# Altium schematic symbol library microbuilder.SCHLIB: 530 symbols (part 5 of 7) (continued)
## MAX6364 (continued)
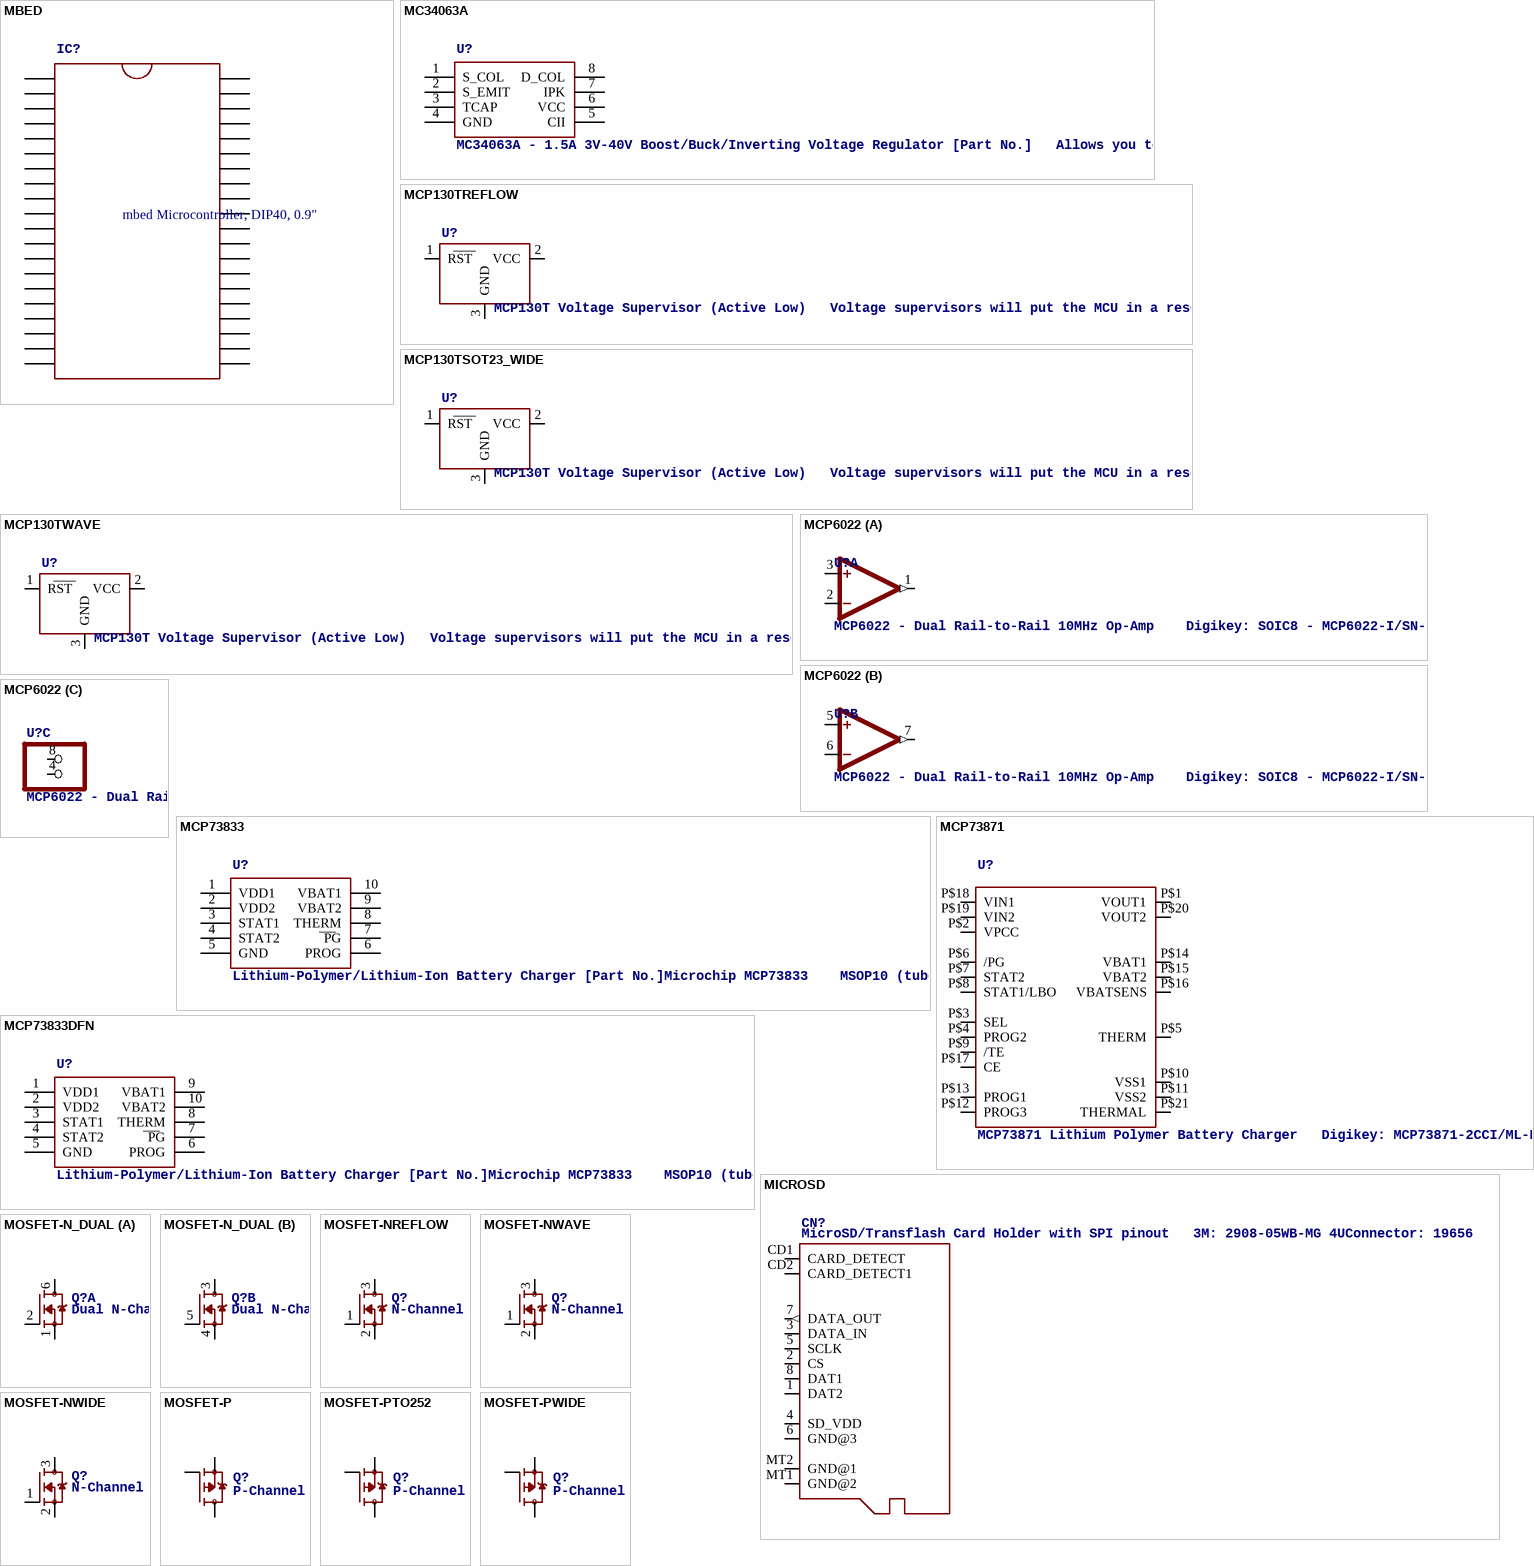
[diagram p43: symbols MBED to MOSFET-PWIDE]

## MBED
designator IC?, comment mbed Microcontroller, DIP40, 0.9"
footprint DIL40_0.9
pins: 1 P$1, 2 P$2, 3 P$3, 4 P$4, 5 P$5, 6 P$6, 7 P$7, 8 P$8, 9 P$9, 10 P$10, 11 P$11, 12 P$12, 13 P$13, 14 P$14, 15 P$15, 16 P$16, 17 P$17, 18 P$18, 19 P$19, 20 P$20, 21 P$21, 22 P$22, 23 P$23, 24 P$24, 25 P$25, 26 P$26, 27 P$27, 28 P$28, 29 P$29, 30 P$30, 31 P$31, 32 P$32, 33 P$33, 34 P$34, 35 P$35, 36 P$36, 37 P$37, 38 P$38, 39 P$39, 40 P$40

## MC34063A
designator U?, comment MC34063A - 1.5A 3V-40V Boost/Buck/Inverting Voltage Regulator [Part No.]   Allows you to 'boost', reduce or invert the voltage of your power supply to a more appropriate level.  Common voltage regulators like the LM1117 are easy to use, but they can only 'reduce' the voltage level and require more volts than they provide, making them useless for low voltage power supplies like batteries or solar panels. A 'Step-Up' regulator like the MC34063A solves this problem by also allowing you to increase the voltage to a pre-determined level, though you still need to pay attention to the minimum voltage level the converter can handle, keeping in mind that many 'step-up' converts are less efficient at the two extreme ends of their working range.   Given that many step-up circuits introduce some ripple to the power supply, you can often get a much 'smoother' supply by boosting the voltage up to 5.0V and then using a standard fixed voltage regulator (such as the common LM1117, etc.) to drop the voltage back down to 3.3V.  This may not be necessary, and some step up regulators can provide a smooth supply on their own, but it's worth keeping in mind if you do encounter some ripple in the power supply using only a step-up IC for your power supply.Texas Instruments MC34063A    Digikey: 296-17765-1-ND
footprint SOIC8_150MIL
pins: 1 S_COL, 2 S_EMIT, 3 TCAP, 4 GND, 5 CII, 6 VCC, 7 IPK, 8 D_COL

## MCP130TREFLOW
designator U?, comment MCP130T Voltage Supervisor (Active Low)   Voltage supervisors will put the MCU in a reset state if the voltage drops below a pre-determined level.   SOT23-R/SOT23-W: Voltage Supervisor - 3.15V Active Low       Note: Use the "Reflow" footprint when working with solder paste, and the "Wave" footprint when soldering by hand with a soldering iron (the latter has larger pads that are easier to solder by hand).   Digikey: MCP130T-315I/TTCT-ND
footprint SOT23-R
pins: 1 RST, 2 VCC (power), 3 GND (power)

## MCP130TSOT23_WIDE
designator U?, comment MCP130T Voltage Supervisor (Active Low)   Voltage supervisors will put the MCU in a reset state if the voltage drops below a pre-determined level.   SOT23-R/SOT23-W: Voltage Supervisor - 3.15V Active Low       Note: Use the "Reflow" footprint when working with solder paste, and the "Wave" footprint when soldering by hand with a soldering iron (the latter has larger pads that are easier to solder by hand).   Digikey: MCP130T-315I/TTCT-ND
footprint SOT23-WIDE
pins: 1 RST, 2 VCC (power), 3 GND (power)

## MCP130TWAVE
designator U?, comment MCP130T Voltage Supervisor (Active Low)   Voltage supervisors will put the MCU in a reset state if the voltage drops below a pre-determined level.   SOT23-R/SOT23-W: Voltage Supervisor - 3.15V Active Low       Note: Use the "Reflow" footprint when working with solder paste, and the "Wave" footprint when soldering by hand with a soldering iron (the latter has larger pads that are easier to solder by hand).   Digikey: MCP130T-315I/TTCT-ND
footprint SOT23-W
pins: 1 RST, 2 VCC (power), 3 GND (power)

## MCP6022
designator U?, comment MCP6022 - Dual Rail-to-Rail 10MHz Op-Amp    Digikey: SOIC8 - MCP6022-I/SN-ND
footprint SOIC8_150MIL
part A pins: 1 OUT (out), 2 -IN, 3 +IN
part B pins: 5 +IN, 6 -IN, 7 OUT (out)
part C pins: 4 -, 8 +

## MCP73833
designator U?, comment Lithium-Polymer/Lithium-Ion Battery Charger [Part No.]Microchip MCP73833    MSOP10 (tube only):   Digikey: MCP73833T-AMI/UN or MCP73833-FCI/UN-ND Mouser: 579-MCP73833-AMI/UN   DFN10 (tape):   Digikey:    Note Chips ending in 'AMI' have no timer, and chips ending in 'FCI' have a 6-hour timer that will end the charge sequence after 6 horus regqrdless of current charge level.
footprint MSOP10
pins: 1 VDD1, 2 VDD2, 3 STAT1, 4 STAT2, 5 GND, 6 PROG, 7 PG, 8 THERM, 9 VBAT2, 10 VBAT1

## MCP73833DFN
designator U?, comment Lithium-Polymer/Lithium-Ion Battery Charger [Part No.]Microchip MCP73833    MSOP10 (tube only):   Digikey: MCP73833T-AMI/UN or MCP73833-FCI/UN-ND Mouser: 579-MCP73833-AMI/UN   DFN10 (tape):   Digikey:    Note Chips ending in 'AMI' have no timer, and chips ending in 'FCI' have a 6-hour timer that will end the charge sequence after 6 horus regqrdless of current charge level.
footprint DFN10_3X3MM
pins: 1 VDD1, 2 VDD2, 3 STAT1, 4 STAT2, 5 GND, 6 PROG, 7 PG, 8 THERM, 9 VBAT1, 10 VBAT2

## MCP73871
designator U?, comment MCP73871 Lithium Polymer Battery Charger   Digikey: MCP73871-2CCI/ML-ND
footprint QFN20_4MM
pins: P$1 VOUT1, P$2 VPCC, P$3 SEL, P$4 PROG2, P$5 THERM, P$6 /PG, P$7 STAT2, P$8 STAT1/LBO, P$9 /TE, P$10 VSS1, P$11 VSS2, P$12 PROG3, P$13 PROG1, P$14 VBAT1, P$15 VBAT2, P$16 VBATSENS, P$17 CE, P$18 VIN1, P$19 VIN2, P$20 VOUT2, P$21 THERMAL

## MICROSD
designator CN?, comment MicroSD/Transflash Card Holder with SPI pinout   3M: 2908-05WB-MG 4UConnector: 19656   Footprint courtesy: Adafruit Industries
footprint MICROSD
pins: 1 DAT2, 2 CS, 3 DATA_IN, 4 SD_VDD (power), 5 SCLK, 6 GND@3 (power), 7 DATA_OUT (out), 8 DAT1, CD1 CARD_DETECT, CD2 CARD_DETECT1, MT1 GND@2 (power), MT2 GND@1 (power)

## MOSFET-N_DUAL
designator Q?, comment Dual N-Channel MOSFET   SOT363 (2.0x1.25mm) 2N7002PS - 60V, 320mA [Digikey: 568-5984-1-ND]
footprint SOT363
part A pins: 1 S, 2 G, 6 D
part B pins: 3 D, 4 S, 5 G

## MOSFET-NREFLOW
designator Q?, comment N-Channel Mosfet   LEGEND   VDS: Voltage Drain-Source ID: Drain Current RDS(ON): Drain-Source On-State Resistance VGS(TH): Gate-Source Threshold Voltage CISS: Drain-Source Input Capacitance    SOT-23   Name	VDS	ID	RDS(ON)	VGS(TH)	CISS	Order Number	   2N7002E	60V	260mA	2.5 Ohm	2.5V @ 250uA	26.7pF @ 25V	2N7002ET1GOSTR-ND	   BSH103	30V	850mA	400 mOhm	400mV @ 1mA	83pF @ 24V	BSH103,235-ND	   BSS138	60V	320mA	1.6 Ohm	1.5V @ 250uA	50pF @ 10V	Mouser: 771-BSS138PW115	   DMN2075U-7	20V	4.2A	38 mOhm	1V @ 250 uA	594.3pF @ 10V	DMN2075U-7DICT-ND	   							   * BSS138 good choice for I2C level-shifting
footprint SOT23-R
pins: 1 G, 2 S, 3 D

## MOSFET-NWAVE
designator Q?, comment N-Channel Mosfet   LEGEND   VDS: Voltage Drain-Source ID: Drain Current RDS(ON): Drain-Source On-State Resistance VGS(TH): Gate-Source Threshold Voltage CISS: Drain-Source Input Capacitance    SOT-23   Name	VDS	ID	RDS(ON)	VGS(TH)	CISS	Order Number	   2N7002E	60V	260mA	2.5 Ohm	2.5V @ 250uA	26.7pF @ 25V	2N7002ET1GOSTR-ND	   BSH103	30V	850mA	400 mOhm	400mV @ 1mA	83pF @ 24V	BSH103,235-ND	   BSS138	60V	320mA	1.6 Ohm	1.5V @ 250uA	50pF @ 10V	Mouser: 771-BSS138PW115	   DMN2075U-7	20V	4.2A	38 mOhm	1V @ 250 uA	594.3pF @ 10V	DMN2075U-7DICT-ND	   							   * BSS138 good choice for I2C level-shifting
footprint SOT23-W
pins: 1 G, 2 S, 3 D

## MOSFET-NWIDE
designator Q?, comment N-Channel Mosfet   LEGEND   VDS: Voltage Drain-Source ID: Drain Current RDS(ON): Drain-Source On-State Resistance VGS(TH): Gate-Source Threshold Voltage CISS: Drain-Source Input Capacitance    SOT-23   Name	VDS	ID	RDS(ON)	VGS(TH)	CISS	Order Number	   2N7002E	60V	260mA	2.5 Ohm	2.5V @ 250uA	26.7pF @ 25V	2N7002ET1GOSTR-ND	   BSH103	30V	850mA	400 mOhm	400mV @ 1mA	83pF @ 24V	BSH103,235-ND	   BSS138	60V	320mA	1.6 Ohm	1.5V @ 250uA	50pF @ 10V	Mouser: 771-BSS138PW115	   DMN2075U-7	20V	4.2A	38 mOhm	1V @ 250 uA	594.3pF @ 10V	DMN2075U-7DICT-ND	   							   * BSS138 good choice for I2C level-shifting
footprint SOT23-WIDE
pins: 1 G, 2 S, 3 D

## MOSFET-P
designator Q?, comment P-Channel Mosfet   LEGEND   VDS: Voltage Drain-Source ID: Drain Current RDS(ON): Drain-Source On-State Resistance VGS(TH): Gate-Source Threshold Voltage CISS: Drain-Source Input Capacitance    SOT-23   Name	VDS	ID	RDS(ON)	VGS(TH)	CISS	Order Number	   IRLML5103	30V	760mA	600 mOhm	--	75pF @ 25V	Digikey: IRLML5103PBFCT-ND	   IRLML6401	12V	4.3A	50 mOhm	950mV @ 250µA	830pF @ 10V	Digikey: IRLML6401PBFTR-ND	   NTR0202PL	20V	400mA	800 mOhm	2.3V @ 250uA	70pF @ 5V	Digikey: NTR0202PLT1GOSTR-ND	   NTR4101PT1G	20V	1.8A	85 mOhm	1.2V @ 250uA	675pF @ 10V	Digikey: NTR4101PT1GOSCT-ND	   DMP2004K	20V	600mA	900 mOhm	1V @ 250uA	175pF @ 16V	Digikey: DMP2004KDICT-ND	   PMV65XP	20V	3.9A	76 mOhm	950mV @ 1mA	725pF @ 20V	Digikey: 568-2358-2-ND	   							   							TO-252   Name	VDS	ID	RDS(ON)	VGS(TH)	CISS	Order Number	   AOD417	30V	25A	34 mOhm	3V @ 250µA	920pF @ 15V	Digikey: 785-1106-2-ND
footprint SOT23-R
pins: 1 G, 2 S, 3 D

## MOSFET-PTO252
designator Q?, comment P-Channel Mosfet   LEGEND   VDS: Voltage Drain-Source ID: Drain Current RDS(ON): Drain-Source On-State Resistance VGS(TH): Gate-Source Threshold Voltage CISS: Drain-Source Input Capacitance    SOT-23   Name	VDS	ID	RDS(ON)	VGS(TH)	CISS	Order Number	   IRLML5103	30V	760mA	600 mOhm	--	75pF @ 25V	Digikey: IRLML5103PBFCT-ND	   IRLML6401	12V	4.3A	50 mOhm	950mV @ 250µA	830pF @ 10V	Digikey: IRLML6401PBFTR-ND	   NTR0202PL	20V	400mA	800 mOhm	2.3V @ 250uA	70pF @ 5V	Digikey: NTR0202PLT1GOSTR-ND	   NTR4101PT1G	20V	1.8A	85 mOhm	1.2V @ 250uA	675pF @ 10V	Digikey: NTR4101PT1GOSCT-ND	   DMP2004K	20V	600mA	900 mOhm	1V @ 250uA	175pF @ 16V	Digikey: DMP2004KDICT-ND	   PMV65XP	20V	3.9A	76 mOhm	950mV @ 1mA	725pF @ 20V	Digikey: 568-2358-2-ND	   							   							TO-252   Name	VDS	ID	RDS(ON)	VGS(TH)	CISS	Order Number	   AOD417	30V	25A	34 mOhm	3V @ 250µA	920pF @ 15V	Digikey: 785-1106-2-ND
footprint TO252
pins: 1 G, 2 S, 3 D

## MOSFET-PWIDE
designator Q?, comment P-Channel Mosfet   LEGEND   VDS: Voltage Drain-Source ID: Drain Current RDS(ON): Drain-Source On-State Resistance VGS(TH): Gate-Source Threshold Voltage CISS: Drain-Source Input Capacitance    SOT-23   Name	VDS	ID	RDS(ON)	VGS(TH)	CISS	Order Number	   IRLML5103	30V	760mA	600 mOhm	--	75pF @ 25V	Digikey: IRLML5103PBFCT-ND	   IRLML6401	12V	4.3A	50 mOhm	950mV @ 250µA	830pF @ 10V	Digikey: IRLML6401PBFTR-ND	   NTR0202PL	20V	400mA	800 mOhm	2.3V @ 250uA	70pF @ 5V	Digikey: NTR0202PLT1GOSTR-ND	   NTR4101PT1G	20V	1.8A	85 mOhm	1.2V @ 250uA	675pF @ 10V	Digikey: NTR4101PT1GOSCT-ND	   DMP2004K	20V	600mA	900 mOhm	1V @ 250uA	175pF @ 16V	Digikey: DMP2004KDICT-ND	   PMV65XP	20V	3.9A	76 mOhm	950mV @ 1mA	725pF @ 20V	Digikey: 568-2358-2-ND	   							   							TO-252   Name	VDS	ID	RDS(ON)	VGS(TH)	CISS	Order Number	   AOD417	30V	25A	34 mOhm	3V @ 250µA	920pF @ 15V	Digikey: 785-1106-2-ND
footprint SOT23-WIDE
pins: 1 G, 2 S, 3 D

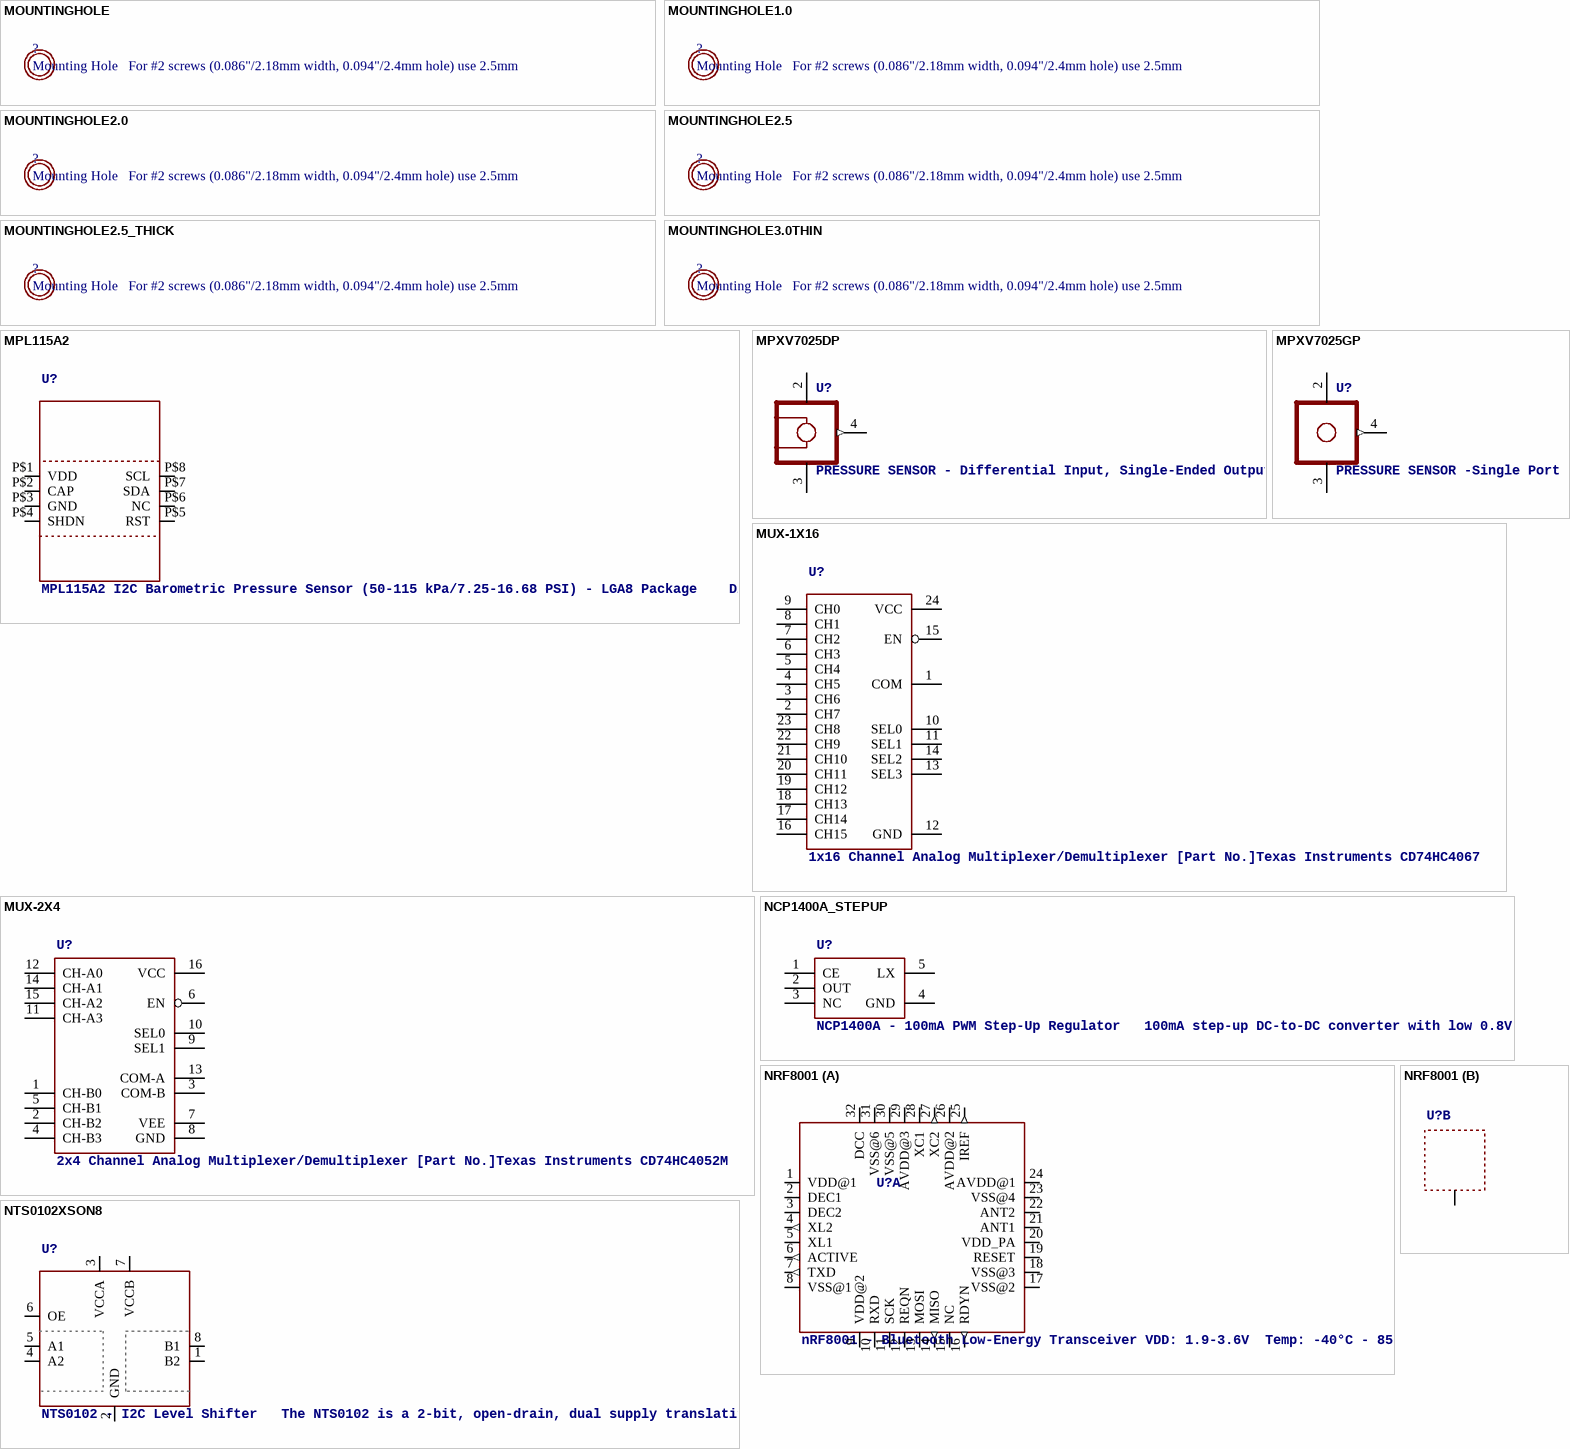
[diagram p44: symbols MOUNTINGHOLE to NTS0102XSON8]

## MOUNTINGHOLE
designator ?, comment Mounting Hole   For #2 screws (0.086"/2.18mm width, 0.094"/2.4mm hole) use 2.5mm
footprint MOUNTINGHOLE_3.0_PLATED

## MOUNTINGHOLE1.0
designator ?, comment Mounting Hole   For #2 screws (0.086"/2.18mm width, 0.094"/2.4mm hole) use 2.5mm
BOM: EXCLUDE
footprint MOUNTINGHOLE_1.0_PLATED

## MOUNTINGHOLE2.0
designator ?, comment Mounting Hole   For #2 screws (0.086"/2.18mm width, 0.094"/2.4mm hole) use 2.5mm
footprint MOUNTINGHOLE_2.0_PLATED

## MOUNTINGHOLE2.5
designator ?, comment Mounting Hole   For #2 screws (0.086"/2.18mm width, 0.094"/2.4mm hole) use 2.5mm
footprint MOUNTINGHOLE_2.5_PLATED

## MOUNTINGHOLE2.5_THICK
designator ?, comment Mounting Hole   For #2 screws (0.086"/2.18mm width, 0.094"/2.4mm hole) use 2.5mm
footprint MOUNTINGHOLE_2.5_PLATED_THICK

## MOUNTINGHOLE3.0THIN
designator ?, comment Mounting Hole   For #2 screws (0.086"/2.18mm width, 0.094"/2.4mm hole) use 2.5mm
footprint MOUNTINGHOLE_3.0_PLATEDTHIN

## MPL115A2
designator U?, comment MPL115A2 I2C Barometric Pressure Sensor (50-115 kPa/7.25-16.68 PSI) - LGA8 Package    Digikey: MPL115A2T1CT-ND
footprint LGA8
pins: P$1 VDD (power), P$2 CAP, P$3 GND (power), P$4 SHDN, P$5 RST, P$6 NC, P$7 SDA, P$8 SCL

## MPXV7025DP
designator U?, comment PRESSURE SENSOR - Differential Input, Single-Ended Output
footprint SOP8-1351
pins: 2 VS (power), 3 GND (power), 4 +VOUT (out)

## MPXV7025GP
designator U?, comment PRESSURE SENSOR -Single Port
footprint SOP8-1369
pins: 2 VS (power), 3 GND (power), 4 OUT (out)

## MUX-1X16
designator U?, comment 1x16 Channel Analog Multiplexer/Demultiplexer [Part No.]Texas Instruments CD74HC4067    Digikey: 296-9226-6-ND
footprint SSOP24
pins: 1 COM, 2 CH7, 3 CH6, 4 CH5, 5 CH4, 6 CH3, 7 CH2, 8 CH1, 9 CH0, 10 SEL0, 11 SEL1, 12 GND, 13 SEL3, 14 SEL2, 15 EN, 16 CH15, 17 CH14, 18 CH13, 19 CH12, 20 CH11, 21 CH10, 22 CH9, 23 CH8, 24 VCC

## MUX-2X4
designator U?, comment 2x4 Channel Analog Multiplexer/Demultiplexer [Part No.]Texas Instruments CD74HC4052M    Digikey: 296-9218-5-ND
footprint SOIC16
pins: 1 CH-B0, 2 CH-B2, 3 COM-B, 4 CH-B3, 5 CH-B1, 6 EN, 7 VEE, 8 GND, 9 SEL1, 10 SEL0, 11 CH-A3, 12 CH-A0, 13 COM-A, 14 CH-A1, 15 CH-A2, 16 VCC

## NCP1400A_STEPUP
designator U?, comment NCP1400A - 100mA PWM Step-Up Regulator   100mA step-up DC-to-DC converter with low 0.8V startup. 3.3V Version (SOT23-5) - Digikey: NCP1400ASN33T1GOSCT-ND  5.0V Version (SOT23-5) - Digikey: NCP1400ASN50T1GOSCT-ND       NCP1402 - 200mA PWM Step-Up Regulator   200mA step-up DC-to-DC converter with low 0.8V startup 3.3V Version (SOT23-5) - Digikey: NCP1402SN33T1GOSCT-ND  5.0V Version (SOT23-5) - Digikey: NCP1402SN50T1GOSCT-ND
footprint SOT23-5
pins: 1 CE, 2 OUT, 3 NC, 4 GND, 5 LX

## NRF8001
designator U?, comment nRF8001 - Bluetooth Low-Energy Transceiver VDD: 1.9-3.6V  Temp: -40°C - 85°C
footprint QFN32_5MM
part A pins: 1 VDD@1 (power), 2 DEC1, 3 DEC2, 4 XL2 (out), 5 XL1, 6 ACTIVE (out), 7 TXD (out), 8 VSS@1 (power), 9 VDD@2 (power), 10 RXD, 11 SCK, 12 REQN, 13 MOSI, 14 MISO (out), 15 NC, 16 RDYN (out), 17 VSS@2 (power), 18 VSS@3 (power), 19 RESET, 20 VDD_PA, 21 ANT1, 22 ANT2, 23 VSS@4 (power), 24 AVDD@1 (power), 25 IREF (out), 26 AVDD@2 (power), 27 XC2 (out), 28 XC1, 29 AVDD@3 (power), 30 VSS@5 (power), 31 VSS@6 (power), 32 DCC
part B pins: 33 TP (power)

## NTS0102XSON8
designator U?, comment NTS0102 - I2C Level Shifter   The NTS0102 is a 2-bit, open-drain, dual supply translating transceiver with auto direction sensing, that enables bidirectional voltage level translation. VCCA: 1.65-3.6V  VCCB: 2.3V-5.5V  Max Data Rate: 50 Mbps  Temperature: -40°C - 125°C     XSON8 Package (NTS0102GT) - Mouser: 771-NTS0102GT115
footprint SOT833-1
pins: 1 B2, 2 GND, 3 VCCA, 4 A2, 5 A1, 6 OE, 7 VCCB, 8 B1

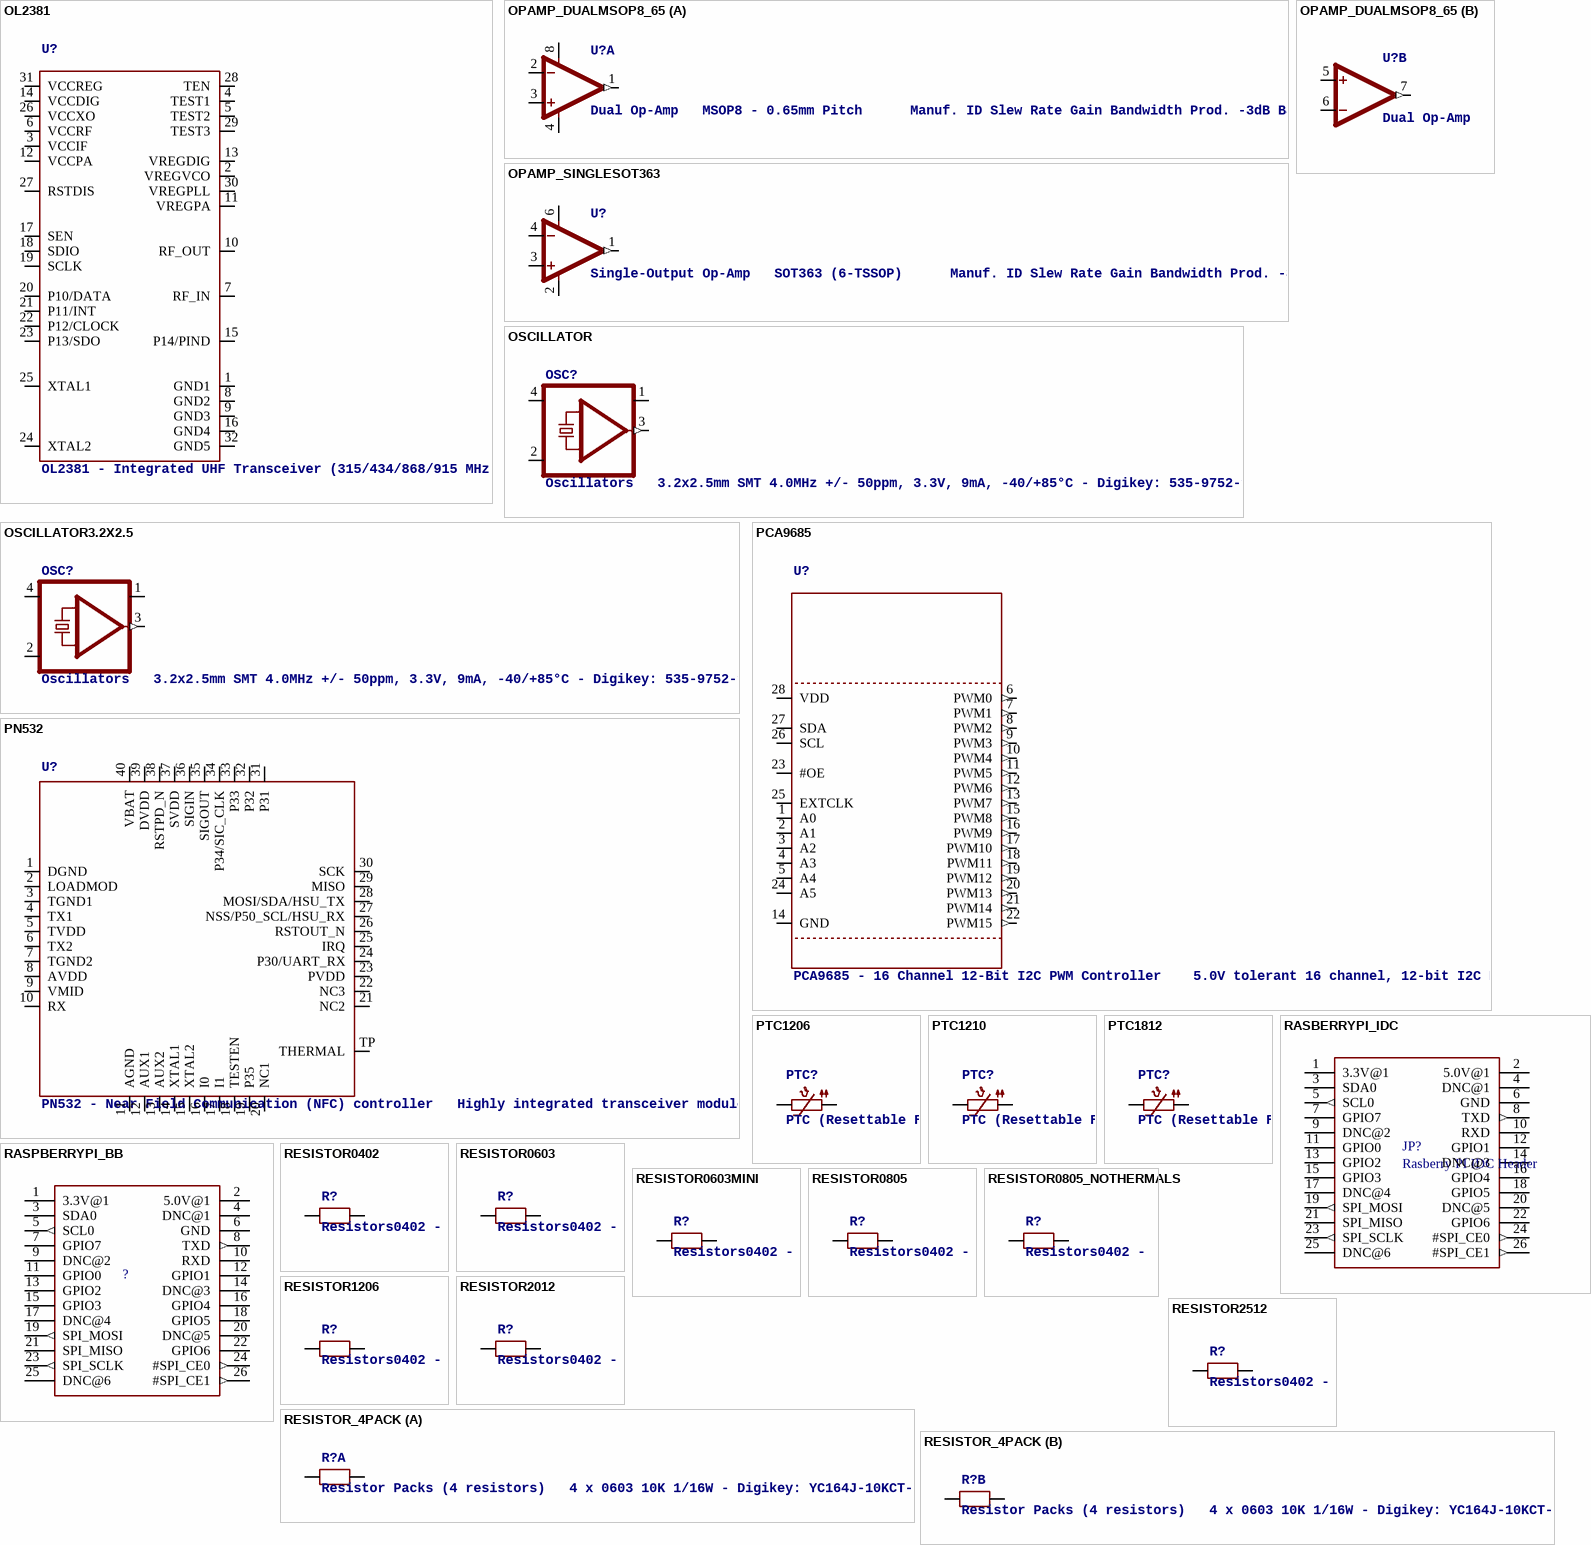
[diagram p45: symbols OL2381 to RESISTOR_4PACK]

## OL2381
designator U?, comment OL2381 - Integrated UHF Transceiver (315/434/868/915 MHz)
footprint HVQFN32-5X5
pins: 1 GND1, 2 VREGVCO, 3 VCCIF, 4 TEST1, 5 TEST2, 6 VCCRF, 7 RF_IN, 8 GND2, 9 GND3, 10 RF_OUT, 11 VREGPA, 12 VCCPA, 13 VREGDIG, 14 VCCDIG, 15 P14/PIND, 16 GND4, 17 SEN, 18 SDIO, 19 SCLK, 20 P10/DATA, 21 P11/INT, 22 P12/CLOCK, 23 P13/SDO, 24 XTAL2, 25 XTAL1, 26 VCCXO, 27 RSTDIS, 28 TEN, 29 TEST3, 30 VREGPLL, 31 VCCREG, 32 GND5

## OPAMP_DUALMSOP8_65
designator U?, comment Dual Op-Amp   MSOP8 - 0.65mm Pitch      Manuf. ID	Slew Rate	Gain Bandwidth Prod.	-3dB Bandwidth	Current Input Bias	Voltage Input Offset	Supply - Single	Supply - Dual	Digikey	Mouser	   EL5236IYZ-T7	128V/µs 	300MHz	250MHz	6.5µA	100µV	5-12V	+/-2.5-6V	EL5236IYZ-T7TR-ND	--
footprint MSOP8_0.65MM
part A pins: 1 OUT (out), 2 -IN, 3 +IN, 4 V- (power), 8 V+ (power)
part B pins: 5 +IN, 6 -IN, 7 OUT (out)

## OPAMP_SINGLESOT363
designator U?, comment Single-Output Op-Amp   SOT363 (6-TSSOP)      Manuf. ID	Slew Rate	Gain Bandwidth Prod.	-3dB Bandwidth	Current Input Bias	Voltage Input Offset	Supply - Single	Supply - Dual	Digikey	Mouser	   LMV341MG/NOPB	1V/µs 	1MHz	--	0.02pA	25µV	2.4-5.5V		LMV341MGTR-ND	926-LMV341MG/NOPB	   LMH6601MG/NOPB	275V/µs 	155MHz	250MHz	5pA	1000µV	2.4-5.5V	+/-1.2-2.75V	LMH6601MGCT-ND	926-LMH6601MG/NOPB
footprint SOT363
pins: 1 OUT (out), 2 V- (power), 3 +IN, 4 -IN, 6 V+ (power)

## OSCILLATOR
designator OSC?, comment Oscillators   3.2x2.5mm SMT 4.0MHz +/- 50ppm, 3.3V, 9mA, -40/+85°C - Digikey: 535-9752-1-ND  50MHz +/- 50ppm, 3.3V, 8mA, -10/+70°C - Digikey: 478-4792-1-ND       5x7mm SMT 4.0MHz +/-20ppm 3.3V, 20mA, -20/+70°C - Digikey: 535-9329-2-ND  50MHz +/- 25ppm 3.3V, 35mA, -40/+85°C - Digikey: 631-1197-1-ND
footprint OSC_7X5MM
pins: 1 INH, 2 GND (power), 3 OUT (out), 4 VCC (power)

## OSCILLATOR3.2X2.5
designator OSC?, comment Oscillators   3.2x2.5mm SMT 4.0MHz +/- 50ppm, 3.3V, 9mA, -40/+85°C - Digikey: 535-9752-1-ND  50MHz +/- 50ppm, 3.3V, 8mA, -10/+70°C - Digikey: 478-4792-1-ND       5x7mm SMT 4.0MHz +/-20ppm 3.3V, 20mA, -20/+70°C - Digikey: 535-9329-2-ND  50MHz +/- 25ppm 3.3V, 35mA, -40/+85°C - Digikey: 631-1197-1-ND
footprint OSC_3.2X2.5MM
pins: 1 INH, 2 GND (power), 3 OUT (out), 4 VCC (power)

## PCA9685
designator U?, comment PCA9685 - 16 Channel 12-Bit I2C PWM Controller    5.0V tolerant 16 channel, 12-bit I2C PWM controller with 25mA per output (max. 400mA total)   Digikey: 568-5931-1-ND
footprint TSSOP28
pins: 1 A0, 2 A1, 3 A2, 4 A3, 5 A4, 6 PWM0 (out), 7 PWM1 (out), 8 PWM2 (out), 9 PWM3 (out), 10 PWM4 (out), 11 PWM5 (out), 12 PWM6 (out), 13 PWM7 (out), 14 GND (power), 15 PWM8 (out), 16 PWM9 (out), 17 PWM10 (out), 18 PWM11 (out), 19 PWM12 (out), 20 PWM13 (out), 21 PWM14 (out), 22 PWM15 (out), 23 #OE, 24 A5, 25 EXTCLK, 26 SCL, 27 SDA, 28 VDD (power)

## PN532
designator U?, comment PN532 - Near Field Communication (NFC) controller   Highly integrated transceiver module for contactless communication at 13.56 MHz (14443A/MIFARE, FeliCa, I4443B)
footprint HVQFN40-6X6
pins: 1 DGND, 2 LOADMOD, 3 TGND1, 4 TX1, 5 TVDD, 6 TX2, 7 TGND2, 8 AVDD, 9 VMID, 10 RX, 11 AGND, 12 AUX1, 13 AUX2, 14 XTAL1, 15 XTAL2, 16 I0, 17 I1, 18 TESTEN, 19 P35, 20 NC1, 21 NC2, 22 NC3, 23 PVDD, 24 P30/UART_RX, 25 IRQ, 26 RSTOUT_N, 27 NSS/P50_SCL/HSU_RX, 28 MOSI/SDA/HSU_TX, 29 MISO, 30 SCK, 31 P31, 32 P32, 33 P33, 34 P34/SIC_CLK, 35 SIGOUT, 36 SIGIN, 37 SVDD, 38 RSTPD_N, 39 DVDD, 40 VBAT, TP THERMAL

## PTC1206
designator PTC?, comment PTC (Resettable Fuse)   1206 Package 250mA PTC (16V Max, Time-to-Trip: 0.08s) - Digikey: F2110CT-ND       1210 Package 100mA PTC (30V Max, Time-to-Trip: 0.6s) - Digikey: MF-USMF010-2CT-ND       1812 Package 750mA PTC (24V Max, Time-to-Trip: 0.2s) - Digikey: MF-MSMF075/24-2CT-ND
footprint 1206
pins: 1, 2

## PTC1210
designator PTC?, comment PTC (Resettable Fuse)   1206 Package 250mA PTC (16V Max, Time-to-Trip: 0.08s) - Digikey: F2110CT-ND       1210 Package 100mA PTC (30V Max, Time-to-Trip: 0.6s) - Digikey: MF-USMF010-2CT-ND       1812 Package 750mA PTC (24V Max, Time-to-Trip: 0.2s) - Digikey: MF-MSMF075/24-2CT-ND
footprint PTC1210
pins: P$1 1, P$2 2

## PTC1812
designator PTC?, comment PTC (Resettable Fuse)   1206 Package 250mA PTC (16V Max, Time-to-Trip: 0.08s) - Digikey: F2110CT-ND       1210 Package 100mA PTC (30V Max, Time-to-Trip: 0.6s) - Digikey: MF-USMF010-2CT-ND       1812 Package 750mA PTC (24V Max, Time-to-Trip: 0.2s) - Digikey: MF-MSMF075/24-2CT-ND
footprint PTC1812
pins: P$1 1, P$2 2

## RASBERRYPI_IDC
designator JP?, comment Rasberry PI IDC Header
footprint RASBERRYPI_IDC
pins: 1 3.3V@1 (oe), 2 5.0V@1 (oe), 3 SDA0, 4 DNC@1, 5 SCL0 (out), 6 GND (oe), 7 GPIO7, 8 TXD (out), 9 DNC@2, 10 RXD, 11 GPIO0, 12 GPIO1, 13 GPIO2, 14 DNC@3, 15 GPIO3, 16 GPIO4, 17 DNC@4, 18 GPIO5, 19 SPI_MOSI (out), 20 DNC@5, 21 SPI_MISO, 22 GPIO6, 23 SPI_SCLK (out), 24 #SPI_CE0 (out), 25 DNC@6, 26 #SPI_CE1 (out)

## RASPBERRYPI_BB
designator ?
footprint RASBERRYPI_SHIELD
pins: 1 3.3V@1 (oe), 2 5.0V@1 (oe), 3 SDA0, 4 DNC@1, 5 SCL0 (out), 6 GND (oe), 7 GPIO7, 8 TXD (out), 9 DNC@2, 10 RXD, 11 GPIO0, 12 GPIO1, 13 GPIO2, 14 DNC@3, 15 GPIO3, 16 GPIO4, 17 DNC@4, 18 GPIO5, 19 SPI_MOSI (out), 20 DNC@5, 21 SPI_MISO, 22 GPIO6, 23 SPI_SCLK (out), 24 #SPI_CE0 (out), 25 DNC@6, 26 #SPI_CE1 (out)

## RESISTOR0402
designator R?, comment Resistors0402 - 0402 Surface Mount Package  22 Ohm 1% 1/16W [Digikey: 311-22.0LRTR-ND]  33 Ohm 5% 1/16W  1.0K 5% 1/16W  1.5K 5% 1/16W  2.0K 1% 1/16W  10.0K 1% 1/16W [Digikey: 311-10.0KLRTR-ND]  10.0K 5% 1/16W [Digikey: RMCF0402JT10K0TR-ND]  12.1K 1% 1/16W [Digikey: 311-22.0LRTR-ND]  100.0K 5% 1/16W    0603 - 0603 Surface Mount Package  0 Ohm 1/10 Watt 1% Resistor  15 Ohm 1/10 Watt 1% Resistor  33 Ohm 1/10 Watt 1% Resistor  49.9 Ohm 1/10 Watt 1% Resistor  100 Ohm 1/10 Watt 1% Resistor  150 Ohm 1/10 Watt 1% Resistor  240 Ohm 1/10 Watt 1% Resistor  390 Ohm 1/10 Watt 1% Resistor  560 Ohm 1/10 Watt 1% Resistor  680 Ohm 1/10 Watt 1% Resistor  750 Ohm 1/10 Watt 1% Resistor  1.0K Ohm 1/10 Watt 1% Resistor  1.5K Ohm 1/10 Watt 1% Resistor  2.0K Ohm 1/10 Watt 1% Resistor  2.2K Ohm 1/10 Watt 1% Resistor  3.3K Ohm 1/10 Watt 1% Resistor  4.7K Ohm 1/10 Watt 1% Resistor  10.0K Ohm 1/10 Watt 1% Resistor  12.0K Ohm 1/10 Watt 1% Resistor  12.1K Ohm 1/10 Watt 1% Resistor  20.0K Ohm 1/10 Watt 1% Resistor  33.0K Ohm 1/10 Watt 1% Resistor  100.0K Ohm 1/10 Watt 1% Resistor    0805 - 0805 Surface Mount Package  0 Ohm 1/8 Watt 1% Resistor  33 Ohm 1/8 Watt 1% Resistor  100 Ohm 1/8 Watt 1% Resistor  150 Ohm 1/8 Watt 1% Resistor  200 Ohm 1/8 Watt 1% Resistor  240 Ohm 1/8 Watt 1% Resistor  330 Ohm 1/8 Watt 1% Resistor  390 Ohm 1/8 Watt 1% Resistor  470 Ohm 1/8 Watt 1% Resistor  1.0K Ohm 1/8 Watt 1% Resistor  1.5K Ohm 1/8 Watt 1% Resistor  2.0K Ohm 1/8 Watt 1% Resistor  4.7K Ohm 1/8 Watt 1% Resistor  5.1K Ohm 1/8 Watt 1% Resistor  5.6K Ohm 1/8 Watt 1% Resistor  10.0K Ohm 1/8 Watt 1% Resistor  22.0K Ohm 1/8 Watt 1% Resistor  33.0K Ohm 1/8 Watt 1% Resistor  100K Ohm 1/8 Watt 1% Resistor    1206 - 1206 Surface Mount Package  2012 - 2010 Surface Mount Package  0.11 Ohm 1/2 Watt 1% Resistor - Digikey: RHM.11UCT-ND
footprint 0402
pins: 1, 2

## RESISTOR0603
designator R?, comment Resistors0402 - 0402 Surface Mount Package  22 Ohm 1% 1/16W [Digikey: 311-22.0LRTR-ND]  33 Ohm 5% 1/16W  1.0K 5% 1/16W  1.5K 5% 1/16W  2.0K 1% 1/16W  10.0K 1% 1/16W [Digikey: 311-10.0KLRTR-ND]  10.0K 5% 1/16W [Digikey: RMCF0402JT10K0TR-ND]  12.1K 1% 1/16W [Digikey: 311-22.0LRTR-ND]  100.0K 5% 1/16W    0603 - 0603 Surface Mount Package  0 Ohm 1/10 Watt 1% Resistor  15 Ohm 1/10 Watt 1% Resistor  33 Ohm 1/10 Watt 1% Resistor  49.9 Ohm 1/10 Watt 1% Resistor  100 Ohm 1/10 Watt 1% Resistor  150 Ohm 1/10 Watt 1% Resistor  240 Ohm 1/10 Watt 1% Resistor  390 Ohm 1/10 Watt 1% Resistor  560 Ohm 1/10 Watt 1% Resistor  680 Ohm 1/10 Watt 1% Resistor  750 Ohm 1/10 Watt 1% Resistor  1.0K Ohm 1/10 Watt 1% Resistor  1.5K Ohm 1/10 Watt 1% Resistor  2.0K Ohm 1/10 Watt 1% Resistor  2.2K Ohm 1/10 Watt 1% Resistor  3.3K Ohm 1/10 Watt 1% Resistor  4.7K Ohm 1/10 Watt 1% Resistor  10.0K Ohm 1/10 Watt 1% Resistor  12.0K Ohm 1/10 Watt 1% Resistor  12.1K Ohm 1/10 Watt 1% Resistor  20.0K Ohm 1/10 Watt 1% Resistor  33.0K Ohm 1/10 Watt 1% Resistor  100.0K Ohm 1/10 Watt 1% Resistor    0805 - 0805 Surface Mount Package  0 Ohm 1/8 Watt 1% Resistor  33 Ohm 1/8 Watt 1% Resistor  100 Ohm 1/8 Watt 1% Resistor  150 Ohm 1/8 Watt 1% Resistor  200 Ohm 1/8 Watt 1% Resistor  240 Ohm 1/8 Watt 1% Resistor  330 Ohm 1/8 Watt 1% Resistor  390 Ohm 1/8 Watt 1% Resistor  470 Ohm 1/8 Watt 1% Resistor  1.0K Ohm 1/8 Watt 1% Resistor  1.5K Ohm 1/8 Watt 1% Resistor  2.0K Ohm 1/8 Watt 1% Resistor  4.7K Ohm 1/8 Watt 1% Resistor  5.1K Ohm 1/8 Watt 1% Resistor  5.6K Ohm 1/8 Watt 1% Resistor  10.0K Ohm 1/8 Watt 1% Resistor  22.0K Ohm 1/8 Watt 1% Resistor  33.0K Ohm 1/8 Watt 1% Resistor  100K Ohm 1/8 Watt 1% Resistor    1206 - 1206 Surface Mount Package  2012 - 2010 Surface Mount Package  0.11 Ohm 1/2 Watt 1% Resistor - Digikey: RHM.11UCT-ND
footprint 0603
pins: 1, 2

## RESISTOR0603MINI
designator R?, comment Resistors0402 - 0402 Surface Mount Package  22 Ohm 1% 1/16W [Digikey: 311-22.0LRTR-ND]  33 Ohm 5% 1/16W  1.0K 5% 1/16W  1.5K 5% 1/16W  2.0K 1% 1/16W  10.0K 1% 1/16W [Digikey: 311-10.0KLRTR-ND]  10.0K 5% 1/16W [Digikey: RMCF0402JT10K0TR-ND]  12.1K 1% 1/16W [Digikey: 311-22.0LRTR-ND]  100.0K 5% 1/16W    0603 - 0603 Surface Mount Package  0 Ohm 1/10 Watt 1% Resistor  15 Ohm 1/10 Watt 1% Resistor  33 Ohm 1/10 Watt 1% Resistor  49.9 Ohm 1/10 Watt 1% Resistor  100 Ohm 1/10 Watt 1% Resistor  150 Ohm 1/10 Watt 1% Resistor  240 Ohm 1/10 Watt 1% Resistor  390 Ohm 1/10 Watt 1% Resistor  560 Ohm 1/10 Watt 1% Resistor  680 Ohm 1/10 Watt 1% Resistor  750 Ohm 1/10 Watt 1% Resistor  1.0K Ohm 1/10 Watt 1% Resistor  1.5K Ohm 1/10 Watt 1% Resistor  2.0K Ohm 1/10 Watt 1% Resistor  2.2K Ohm 1/10 Watt 1% Resistor  3.3K Ohm 1/10 Watt 1% Resistor  4.7K Ohm 1/10 Watt 1% Resistor  10.0K Ohm 1/10 Watt 1% Resistor  12.0K Ohm 1/10 Watt 1% Resistor  12.1K Ohm 1/10 Watt 1% Resistor  20.0K Ohm 1/10 Watt 1% Resistor  33.0K Ohm 1/10 Watt 1% Resistor  100.0K Ohm 1/10 Watt 1% Resistor    0805 - 0805 Surface Mount Package  0 Ohm 1/8 Watt 1% Resistor  33 Ohm 1/8 Watt 1% Resistor  100 Ohm 1/8 Watt 1% Resistor  150 Ohm 1/8 Watt 1% Resistor  200 Ohm 1/8 Watt 1% Resistor  240 Ohm 1/8 Watt 1% Resistor  330 Ohm 1/8 Watt 1% Resistor  390 Ohm 1/8 Watt 1% Resistor  470 Ohm 1/8 Watt 1% Resistor  1.0K Ohm 1/8 Watt 1% Resistor  1.5K Ohm 1/8 Watt 1% Resistor  2.0K Ohm 1/8 Watt 1% Resistor  4.7K Ohm 1/8 Watt 1% Resistor  5.1K Ohm 1/8 Watt 1% Resistor  5.6K Ohm 1/8 Watt 1% Resistor  10.0K Ohm 1/8 Watt 1% Resistor  22.0K Ohm 1/8 Watt 1% Resistor  33.0K Ohm 1/8 Watt 1% Resistor  100K Ohm 1/8 Watt 1% Resistor    1206 - 1206 Surface Mount Package  2012 - 2010 Surface Mount Package  0.11 Ohm 1/2 Watt 1% Resistor - Digikey: RHM.11UCT-ND
footprint 0603-MINI
pins: 1, 2

## RESISTOR0805
designator R?, comment Resistors0402 - 0402 Surface Mount Package  22 Ohm 1% 1/16W [Digikey: 311-22.0LRTR-ND]  33 Ohm 5% 1/16W  1.0K 5% 1/16W  1.5K 5% 1/16W  2.0K 1% 1/16W  10.0K 1% 1/16W [Digikey: 311-10.0KLRTR-ND]  10.0K 5% 1/16W [Digikey: RMCF0402JT10K0TR-ND]  12.1K 1% 1/16W [Digikey: 311-22.0LRTR-ND]  100.0K 5% 1/16W    0603 - 0603 Surface Mount Package  0 Ohm 1/10 Watt 1% Resistor  15 Ohm 1/10 Watt 1% Resistor  33 Ohm 1/10 Watt 1% Resistor  49.9 Ohm 1/10 Watt 1% Resistor  100 Ohm 1/10 Watt 1% Resistor  150 Ohm 1/10 Watt 1% Resistor  240 Ohm 1/10 Watt 1% Resistor  390 Ohm 1/10 Watt 1% Resistor  560 Ohm 1/10 Watt 1% Resistor  680 Ohm 1/10 Watt 1% Resistor  750 Ohm 1/10 Watt 1% Resistor  1.0K Ohm 1/10 Watt 1% Resistor  1.5K Ohm 1/10 Watt 1% Resistor  2.0K Ohm 1/10 Watt 1% Resistor  2.2K Ohm 1/10 Watt 1% Resistor  3.3K Ohm 1/10 Watt 1% Resistor  4.7K Ohm 1/10 Watt 1% Resistor  10.0K Ohm 1/10 Watt 1% Resistor  12.0K Ohm 1/10 Watt 1% Resistor  12.1K Ohm 1/10 Watt 1% Resistor  20.0K Ohm 1/10 Watt 1% Resistor  33.0K Ohm 1/10 Watt 1% Resistor  100.0K Ohm 1/10 Watt 1% Resistor    0805 - 0805 Surface Mount Package  0 Ohm 1/8 Watt 1% Resistor  33 Ohm 1/8 Watt 1% Resistor  100 Ohm 1/8 Watt 1% Resistor  150 Ohm 1/8 Watt 1% Resistor  200 Ohm 1/8 Watt 1% Resistor  240 Ohm 1/8 Watt 1% Resistor  330 Ohm 1/8 Watt 1% Resistor  390 Ohm 1/8 Watt 1% Resistor  470 Ohm 1/8 Watt 1% Resistor  1.0K Ohm 1/8 Watt 1% Resistor  1.5K Ohm 1/8 Watt 1% Resistor  2.0K Ohm 1/8 Watt 1% Resistor  4.7K Ohm 1/8 Watt 1% Resistor  5.1K Ohm 1/8 Watt 1% Resistor  5.6K Ohm 1/8 Watt 1% Resistor  10.0K Ohm 1/8 Watt 1% Resistor  22.0K Ohm 1/8 Watt 1% Resistor  33.0K Ohm 1/8 Watt 1% Resistor  100K Ohm 1/8 Watt 1% Resistor    1206 - 1206 Surface Mount Package  2012 - 2010 Surface Mount Package  0.11 Ohm 1/2 Watt 1% Resistor - Digikey: RHM.11UCT-ND
footprint 0805
pins: 1, 2